# Altium footprint library 687 1xx 140 22.PcbLib: 24 footprints (part 1 of 2)
Each footprint in its own frame and in the unit in brackets; x right, y up, seen from the top. Pads: shape width x height; smd on the part's side, far side on the other; paste and mask are expansions set on the pad; w line width, h text height; cw(c..) or ccw(c..) is an arc to the next point about the centre after c.
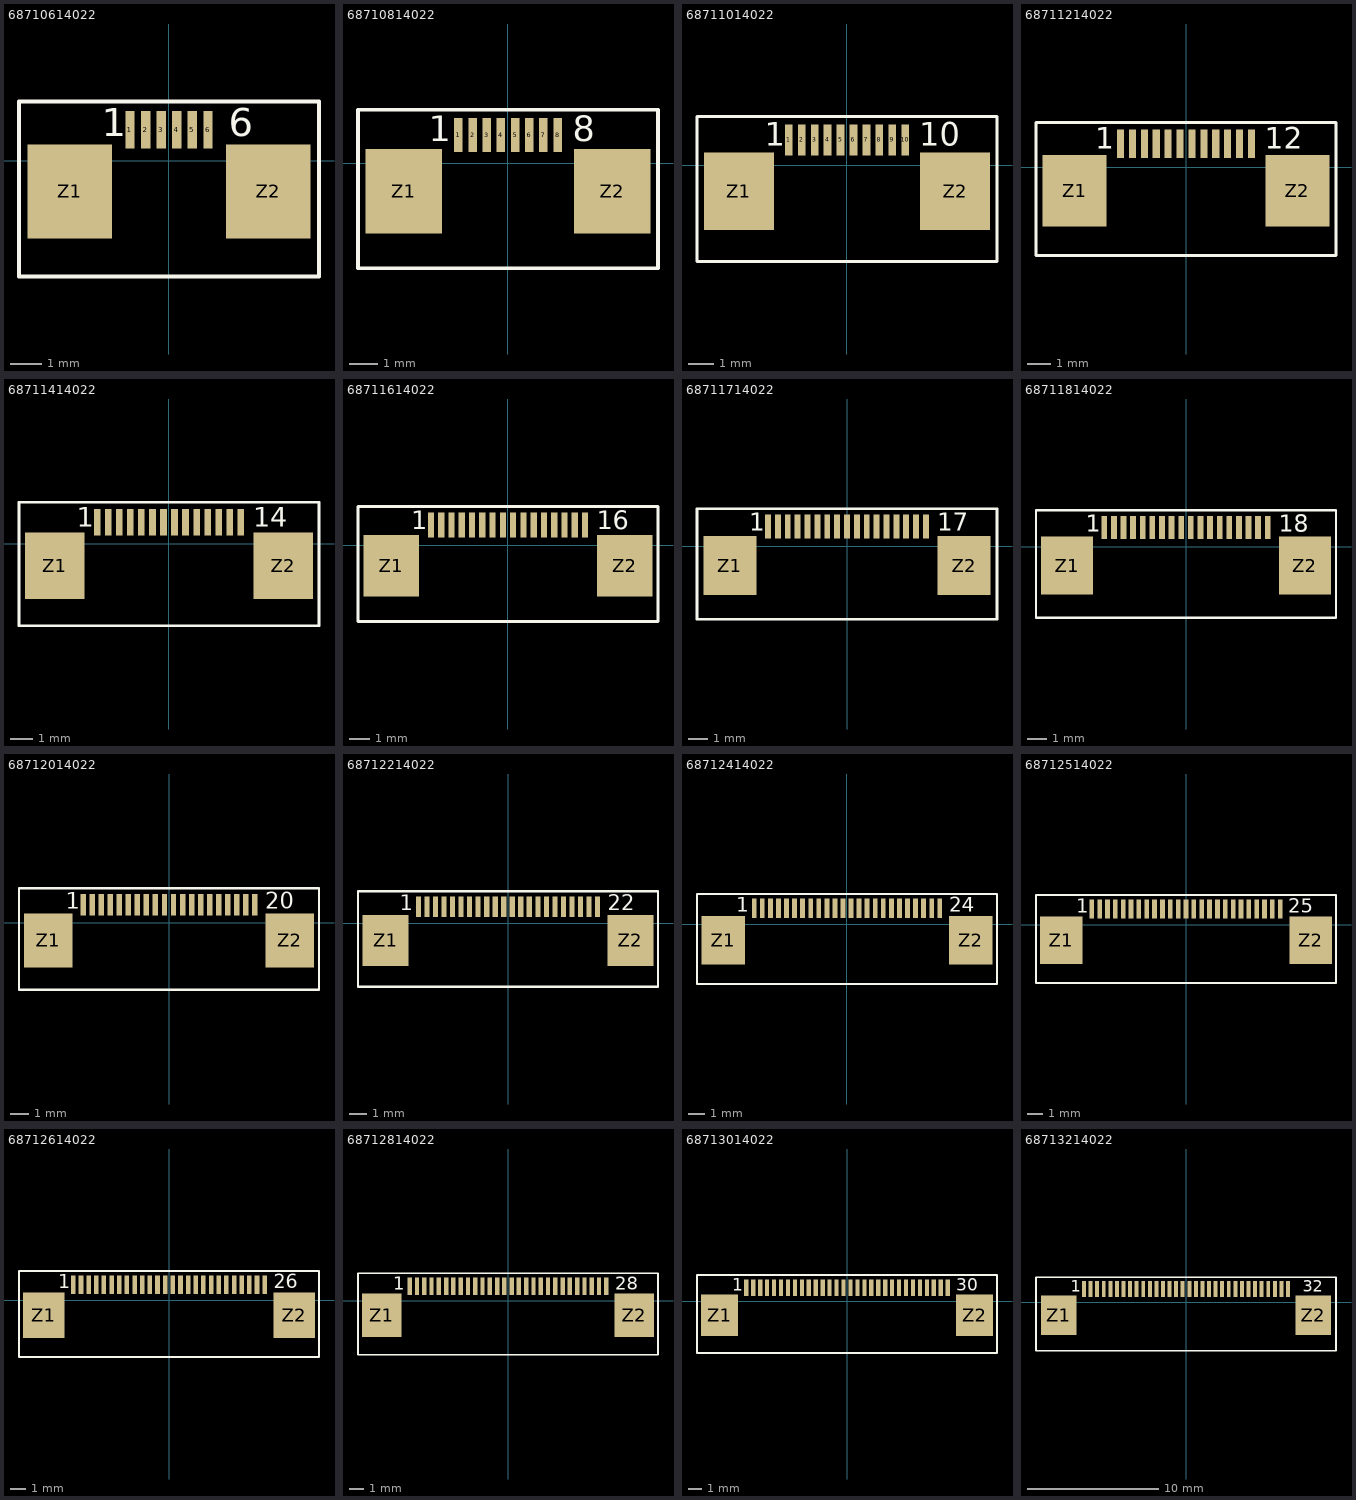
[diagram p0: the footprints below, top view; thin cyan lines are the x and y axes]

## 68710614022 [mm] "06 pins"
height 2.1
pads (8):
  rect 0.3x1.2 smd: 1(-1.25,0.99) 2(-0.75,0.99) 3(-0.25,0.99) 4(0.25,0.99) 5(0.75,0.99) 6(1.25,0.99)
  rect 2.7x3 smd: Z1(-3.18,-0.99) Z2(3.18,-0.99)
Top Overlay:
  lines w0.127: -4.8,-3.71 -4.8,1.89 4.8,1.89 4.8,-3.71 -4.8,-3.71
  text "6" at 1.905,0.771 h0.9
  text "1" at -2.159,0.771 h0.9
3D body: height 2.06, standoff -0.04, extent -4.7,-3.71 4.7,1.39

## 68710814022 [mm] "08 pins"
height 2.1
pads (10):
  rect 0.3x1.2 smd: 1(-1.75,0.99) 2(-1.25,0.99) 3(-0.75,0.99) 4(-0.25,0.99) 5(0.25,0.99) 6(0.75,0.99) 7(1.25,0.99) 8(1.75,0.99)
  rect 2.7x3 smd: Z1(-3.68,-0.99) Z2(3.68,-0.99)
Top Overlay:
  lines w0.127: -5.3,-3.71 -5.3,1.89 5.3,1.89 5.3,-3.71 -5.3,-3.71
  text "1" at -2.794,0.771 h0.9
  text "8" at 2.286,0.771 h0.9
3D body: height 2.06, standoff -0.04, extent -5.2,-3.71 5.2,1.39

## 68711014022 [mm] "10 pins"
height 2.1
pads (12):
  rect 0.3x1.2 smd: 1(-2.25,0.99) 2(-1.75,0.99) 3(-1.25,0.99) 4(-0.75,0.99) 5(-0.25,0.99) 6(0.25,0.99) 7(0.75,0.99) 8(1.25,0.99) 9(1.75,0.99) 10(2.25,0.99)
  rect 2.7x3 smd: Z1(-4.18,-0.99) Z2(4.18,-0.99)
Top Overlay:
  lines w0.127: -5.7,-3.71 5.7,-3.71 ; -5.8,-3.71 -5.8,1.89 5.8,1.89 5.8,-3.71 -5.8,-3.71
  text "10" at 2.794,0.771 h0.9
  text "1" at -3.175,0.771 h0.9
3D body: height 2.06, standoff -0.04, extent -5.7,-3.71 5.7,1.39

## 68711214022 [mm] "12 pins"
height 2.1
pads (14):
  rect 0.3x1.2 smd: 1(-2.75,0.99) 2(-2.25,0.99) 3(-1.75,0.99) 4(-1.25,0.99) 5(-0.75,0.99) 6(-0.25,0.99) 7(0.25,0.99) 8(0.75,0.99) 9(1.25,0.99) 10(1.75,0.99) 11(2.25,0.99) 12(2.75,0.99)
  rect 2.7x3 smd: Z1(-4.68,-0.99) Z2(4.68,-0.99)
Top Overlay:
  lines w0.127: -6.3,-3.71 -6.3,1.89 6.3,1.89 6.3,-3.71 -6.3,-3.71
  text "1" at -3.81,0.771 h0.9
  text "12" at 3.302,0.771 h0.9
3D body: height 2.06, standoff -0.04, extent -6.2,-3.71 6.2,1.39

## 68711414022 [mm] "14 pins"
height 2.1
pads (16):
  rect 0.3x1.2 smd: 1(-3.25,0.99) 2(-2.75,0.99) 3(-2.25,0.99) 4(-1.75,0.99) 5(-1.25,0.99) 6(-0.75,0.99) 7(-0.25,0.99) 8(0.25,0.99) 9(0.75,0.99) 10(1.25,0.99) 11(1.75,0.99) 12(2.25,0.99) 13(2.75,0.99) 14(3.25,0.99)
  rect 2.7x3 smd: Z1(-5.18,-0.99) Z2(5.18,-0.99)
Top Overlay:
  lines w0.127: -6.8,-3.71 -6.8,1.89 6.8,1.89 6.8,-3.71 -6.8,-3.71
  text "1" at -4.191,0.771 h0.9
  text "14" at 3.81,0.771 h0.9
3D body: height 2.06, standoff -0.04, extent -6.7,-3.71 6.7,1.39

## 68711614022 [mm] "16 pins"
height 2.1
pads (18):
  rect 0.3x1.2 smd: 1(-3.75,0.99) 2(-3.25,0.99) 3(-2.75,0.99) 4(-2.25,0.99) 5(-1.75,0.99) 6(-1.25,0.99) 7(-0.75,0.99) 8(-0.25,0.99) 9(0.25,0.99) 10(0.75,0.99) 11(1.25,0.99) 12(1.75,0.99) 13(2.25,0.99) 14(2.75,0.99) 15(3.25,0.99) 16(3.75,0.99)
  rect 2.7x3 smd: Z1(-5.68,-0.99) Z2(5.68,-0.99)
Top Overlay:
  lines w0.127: -7.3,-3.71 -7.3,1.89 7.3,1.89 7.3,-3.71 -7.3,-3.71
  text "1" at -4.699,0.771 h0.9
  text "16" at 4.318,0.771 h0.9
3D body: height 2.06, standoff -0.04, extent -7.2,-3.71 7.2,1.39

## 68711714022 [mm] "17 pins"
height 2.1
pads (19):
  rect 0.3x1.2 smd: 1(-4,0.99) 2(-3.5,0.99) 3(-3,0.99) 4(-2.5,0.99) 5(-2,0.99) 6(-1.5,0.99) 7(-1,0.99) 8(-0.5,0.99) 9(0,0.99) 10(0.5,0.99) 11(1,0.99) 12(1.5,0.99) 13(2,0.99) 14(2.5,0.99) 15(3,0.99) 16(3.5,0.99) 17(4,0.99)
  rect 2.7x3 smd: Z1(-5.93,-0.99) Z2(5.93,-0.99)
Top Overlay:
  lines w0.127: -7.6,-3.71 7.6,-3.71 7.6,1.89 -7.6,1.89 -7.6,-3.71
  text "1" at -4.949,0.771 h0.9
  text "17" at 4.576,0.771 h0.9
3D body: height 2.06, standoff -0.04, extent -7.45,-3.71 7.45,1.39

## 68711814022 [mm] "18 pins"
height 2.1
pads (20):
  rect 0.3x1.2 smd: 1(-4.25,0.99) 2(-3.75,0.99) 3(-3.25,0.99) 4(-2.75,0.99) 5(-2.25,0.99) 6(-1.75,0.99) 7(-1.25,0.99) 8(-0.75,0.99) 9(-0.25,0.99) 10(0.25,0.99) 11(0.75,0.99) 12(1.25,0.99) 13(1.75,0.99) 14(2.25,0.99) 15(2.75,0.99) 16(3.25,0.99) 17(3.75,0.99) 18(4.25,0.99)
  rect 2.7x3 smd: Z1(-6.18,-0.99) Z2(6.18,-0.99)
Top Overlay:
  lines w0.127: -7.8,-3.71 -7.8,1.89 7.8,1.89 7.8,-3.71 -7.8,-3.71
  text "1" at -5.207,0.771 h0.9
  text "18" at 4.826,0.771 h0.9
3D body: height 2.06, standoff -0.04, extent -7.7,-3.71 7.7,1.39

## 68712014022 [mm] "20 pins"
height 2.1
pads (22):
  rect 0.3x1.2 smd: 1(-4.75,0.99) 2(-4.25,0.99) 3(-3.75,0.99) 4(-3.25,0.99) 5(-2.75,0.99) 6(-2.25,0.99) 7(-1.75,0.99) 8(-1.25,0.99) 9(-0.75,0.99) 10(-0.25,0.99) 11(0.25,0.99) 12(0.75,0.99) 13(1.25,0.99) 14(1.75,0.99) 15(2.25,0.99) 16(2.75,0.99) 17(3.25,0.99) 18(3.75,0.99) 19(4.25,0.99) 20(4.75,0.99)
  rect 2.7x3 smd: Z1(-6.68,-0.99) Z2(6.68,-0.99)
Top Overlay:
  lines w0.127: -8.3,-3.71 8.3,-3.71 8.3,1.89 -8.3,1.89 -8.3,-3.71
  text "1" at -5.715,0.771 h0.9
  text "20" at 5.334,0.771 h0.9
3D body: height 2.06, standoff -0.04, extent -8.2,-3.71 8.2,1.39

## 68712214022 [mm] "22 pins"
height 2.1
pads (24):
  rect 0.3x1.2 smd: 1(-5.25,0.99) 2(-4.75,0.99) 3(-4.25,0.99) 4(-3.75,0.99) 5(-3.25,0.99) 6(-2.75,0.99) 7(-2.25,0.99) 8(-1.75,0.99) 9(-1.25,0.99) 10(-0.75,0.99) 11(-0.25,0.99) 12(0.25,0.99) 13(0.75,0.99) 14(1.25,0.99) 15(1.75,0.99) 16(2.25,0.99) 17(2.75,0.99) 18(3.25,0.99) 19(3.75,0.99) 20(4.25,0.99) 21(4.75,0.99) 22(5.25,0.99)
  rect 2.7x3 smd: Z1(-7.18,-0.99) Z2(7.18,-0.99)
Top Overlay:
  lines w0.127: -8.8,-3.71 8.8,-3.71 8.8,1.89 -8.8,1.89 -8.8,-3.71
  text "22" at 5.842,0.771 h0.9
  text "1" at -6.35,0.771 h0.9
3D body: height 2.06, standoff -0.04, extent -8.7,-3.71 8.7,1.39

## 68712414022 [mm] "24 pins"
height 2.1
pads (26):
  rect 0.3x1.2 smd: 1(-5.75,0.99) 2(-5.25,0.99) 3(-4.75,0.99) 4(-4.25,0.99) 5(-3.75,0.99) 6(-3.25,0.99) 7(-2.75,0.99) 8(-2.25,0.99) 9(-1.75,0.99) 10(-1.25,0.99) 11(-0.75,0.99) 12(-0.25,0.99) 13(0.25,0.99) 14(0.75,0.99) 15(1.25,0.99) 16(1.75,0.99) 17(2.25,0.99) 18(2.75,0.99) 19(3.25,0.99) 20(3.75,0.99) 21(4.25,0.99) 22(4.75,0.99) 23(5.25,0.99) 24(5.75,0.99)
  rect 2.7x3 smd: Z1(-7.68,-0.99) Z2(7.68,-0.99)
Top Overlay:
  lines w0.127: -9.3,-3.71 9.3,-3.71 9.3,1.89 -9.3,1.89 -9.3,-3.71
  text "1" at -6.858,0.771 h0.9
  text "24" at 6.35,0.771 h0.9
3D body: height 2.06, standoff -0.04, extent -9.2,-3.71 9.2,1.39

## 68712514022 [mm] "25 pins"
height 2.1
pads (27):
  rect 0.3x1.2 smd: 1(-6,0.99) 2(-5.5,0.99) 3(-5,0.99) 4(-4.5,0.99) 5(-4,0.99) 6(-3.5,0.99) 7(-3,0.99) 8(-2.5,0.99) 9(-2,0.99) 10(-1.5,0.99) 11(-1,0.99) 12(-0.5,0.99) 13(0,0.99) 14(0.5,0.99) 15(1,0.99) 16(1.5,0.99) 17(2,0.99) 18(2.5,0.99) 19(3,0.99) 20(3.5,0.99) 21(4,0.99) 22(4.5,0.99) 23(5,0.99) 24(5.5,0.99) 25(6,0.99)
  rect 2.7x3 smd: Z1(-7.93,-0.99) Z2(7.93,-0.99)
Top Overlay:
  lines w0.127: -9.55,-3.71 9.55,-3.71 9.55,1.89 -9.55,1.89 -9.55,-3.71
  text "1" at -6.989,0.771 h0.9
  text "25" at 6.5,0.75 h0.9
3D body: height 2.06, standoff -0.04, extent -9.45,-3.7 9.45,1.4

## 68712614022 [mm] "26 pins"
height 2.1
pads (28):
  rect 0.3x1.2 smd: 1(-6.25,0.99) 2(-5.75,0.99) 3(-5.25,0.99) 4(-4.75,0.99) 5(-4.25,0.99) 6(-3.75,0.99) 7(-3.25,0.99) 8(-2.75,0.99) 9(-2.25,0.99) 10(-1.75,0.99) 11(-1.25,0.99) 12(-0.75,0.99) 13(-0.25,0.99) 14(0.25,0.99) 15(0.75,0.99) 16(1.25,0.99) 17(1.75,0.99) 18(2.25,0.99) 19(2.75,0.99) 20(3.25,0.99) 21(3.75,0.99) 22(4.25,0.99) 23(4.75,0.99) 24(5.25,0.99) 25(5.75,0.99) 26(6.25,0.99)
  rect 2.7x3 smd: Z1(-8.18,-0.99) Z2(8.18,-0.99)
Top Overlay:
  lines w0.127: -9.8,-3.71 -9.8,1.89 9.8,1.89 9.8,-3.71 -9.8,-3.71
  text "26" at 6.858,0.771 h0.9
  text "1" at -7.239,0.771 h0.9
3D body: height 2.06, standoff -0.04, extent -9.7,-3.71 9.7,1.39

## 68712814022 [mm] "28 pins"
height 2.1
pads (30):
  rect 0.3x1.2 smd: 1(-6.75,0.99) 2(-6.25,0.99) 3(-5.75,0.99) 4(-5.25,0.99) 5(-4.75,0.99) 6(-4.25,0.99) 7(-3.75,0.99) 8(-3.25,0.99) 9(-2.75,0.99) 10(-2.25,0.99) 11(-1.75,0.99) 12(-1.25,0.99) 13(-0.75,0.99) 14(-0.25,0.99) 15(0.25,0.99) 16(0.75,0.99) 17(1.25,0.99) 18(1.75,0.99) 19(2.25,0.99) 20(2.75,0.99) 21(3.25,0.99) 22(3.75,0.99) 23(4.25,0.99) 24(4.75,0.99) 25(5.25,0.99) 26(5.75,0.99) 27(6.25,0.99) 28(6.75,0.99)
  rect 2.7x3 smd: Z1(-8.68,-0.99) Z2(8.68,-0.99)
Top Overlay:
  lines w0.127: -10.3,-3.71 -10.3,1.89 10.3,1.89 10.3,-3.71 -10.3,-3.71
  text "28" at 7.366,0.771 h0.9
  text "1" at -7.874,0.771 h0.9
3D body: height 2.06, standoff -0.04, extent -10.2,-3.71 10.2,1.39

## 68713014022 [mm] "30 pins"
height 2.1
pads (32):
  rect 0.3x1.2 smd: 1(-7.25,0.99) 2(-6.75,0.99) 3(-6.25,0.99) 4(-5.75,0.99) 5(-5.25,0.99) 6(-4.75,0.99) 7(-4.25,0.99) 8(-3.75,0.99) 9(-3.25,0.99) 10(-2.75,0.99) 11(-2.25,0.99) 12(-1.75,0.99) 13(-1.25,0.99) 14(-0.75,0.99) 15(-0.25,0.99) 16(0.25,0.99) 17(0.75,0.99) 18(1.25,0.99) 19(1.75,0.99) 20(2.25,0.99) 21(2.75,0.99) 22(3.25,0.99) 23(3.75,0.99) 24(4.25,0.99) 25(4.75,0.99) 26(5.25,0.99) 27(5.75,0.99) 28(6.25,0.99) 29(6.75,0.99) 30(7.25,0.99)
  rect 2.7x3 smd: Z1(-9.18,-0.99) Z2(9.18,-0.99)
Top Overlay:
  lines w0.127: -10.8,-3.71 10.8,-3.71 10.8,1.89 -10.8,1.89 -10.8,-3.71
  text "1" at -8.255,0.771 h0.9
  text "30" at 7.874,0.771 h0.9
3D body: height 2.06, standoff -0.04, extent -10.7,-3.71 10.7,1.39

## 68713214022 [mm] "32 pins"
height 2.1
pads (34):
  rect 0.3x1.2 smd: 1(-7.75,0.99) 2(-7.25,0.99) 3(-6.75,0.99) 4(-6.25,0.99) 5(-5.75,0.99) 6(-5.25,0.99) 7(-4.75,0.99) 8(-4.25,0.99) 9(-3.75,0.99) 10(-3.25,0.99) 11(-2.75,0.99) 12(-2.25,0.99) 13(-1.75,0.99) 14(-1.25,0.99) 15(-0.75,0.99) 16(-0.25,0.99) 17(0.25,0.99) 18(0.75,0.99) 19(1.25,0.99) 20(1.75,0.99) 21(2.25,0.99) 22(2.75,0.99) 23(3.25,0.99) 24(3.75,0.99) 25(4.25,0.99) 26(4.75,0.99) 27(5.25,0.99) 28(5.75,0.99) 29(6.25,0.99) 30(6.75,0.99) 31(7.25,0.99) 32(7.75,0.99)
  rect 2.7x3 smd: Z1(-9.68,-0.99) Z2(9.68,-0.99)
Top Overlay:
  lines w0.127: -11.4,-3.71 -11.4,1.89 11.4,1.89 11.4,-3.71 -11.4,-3.71
  text "32" at 8.89,0.771 h0.9
  text "1" at -8.763,0.771 h0.9
3D body: height 2.06, standoff -0.04, extent -11.2,-3.71 11.2,1.39